# Altium footprint library Miscellaneous SMD.PcbLib: 82 footprints (part 1 of 7)
Each footprint in its own frame and in the unit in brackets; x right, y up, seen from the top. Pads: shape width x height; smd on the part's side, far side on the other; paste and mask are expansions set on the pad; w line width, h text height; cw(c..) or ccw(c..) is an arc to the next point about the centre after c.
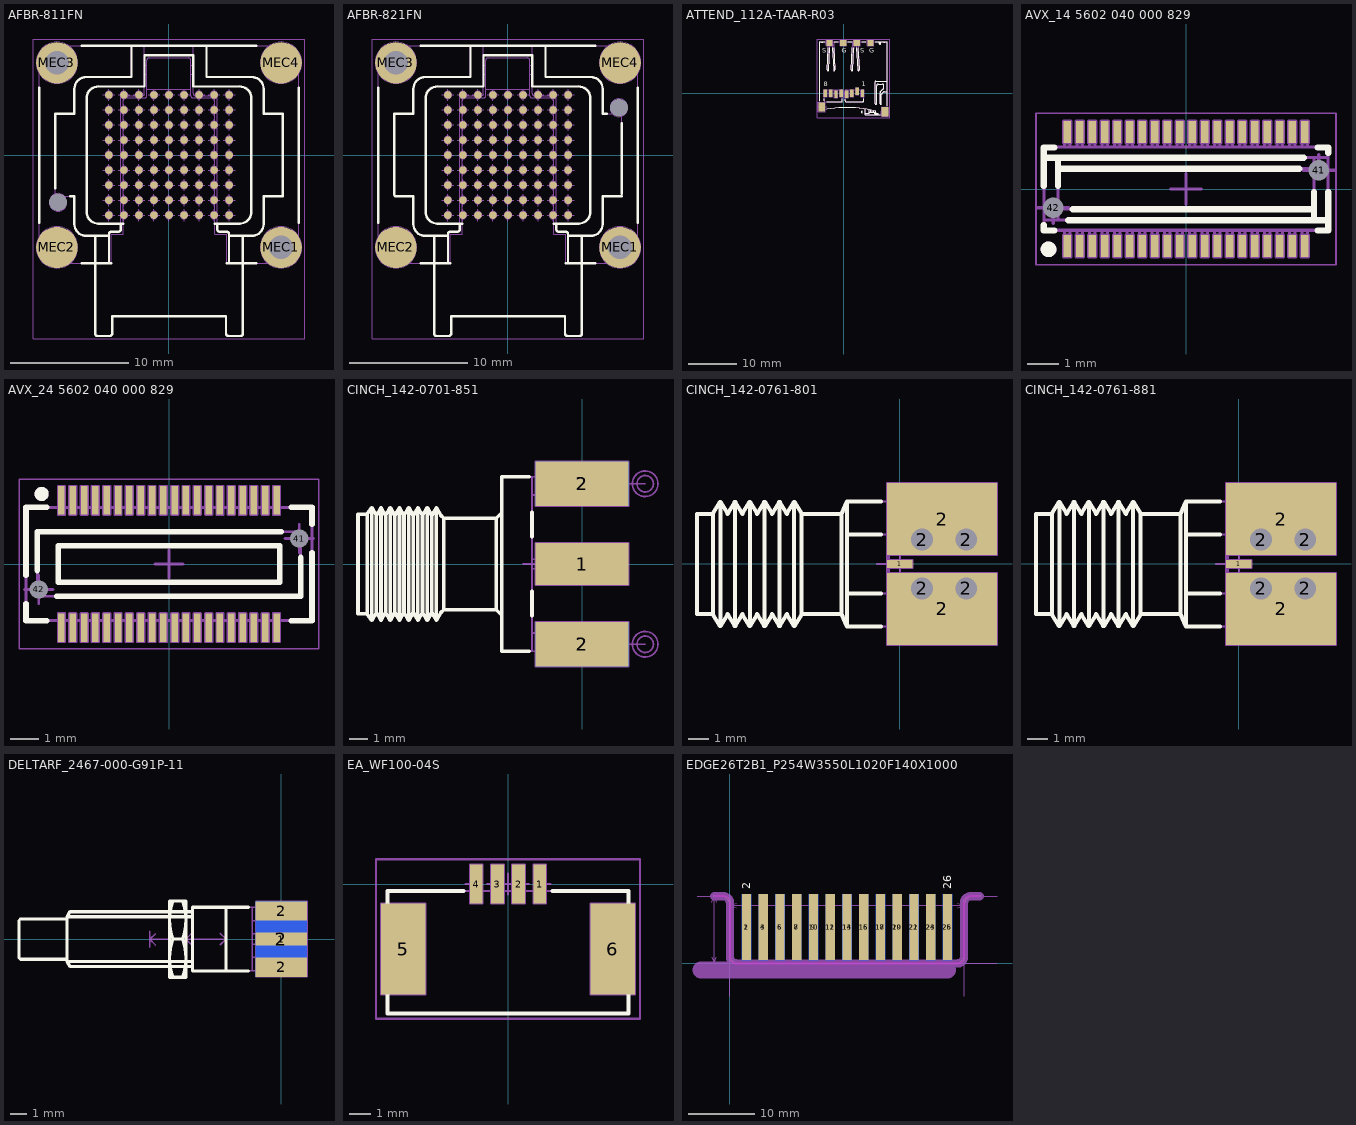
[diagram p0: the footprints below, top view; thin cyan lines are the x and y axes]

## AFBR-811FN [mm] "81 Pin BGA Pitch 1.27mm, 9X9 Fiber Optic Transmitter"
height 14.5
pads (86):
  round 0.64 smd: A1(5.08,-5.08) A2(3.81,-5.08) A3(2.54,-5.08) A4(1.27,-5.08) A5(0,-5.08) A6(-1.27,-5.08) A7(-2.54,-5.08) A8(-3.81,-5.08) A9(-5.08,-5.08) B1(5.08,-3.81) B2(3.81,-3.81) B3(2.54,-3.81) B4(1.27,-3.81) B5(0,-3.81) B6(-1.27,-3.81) B7(-2.54,-3.81) B8(-3.81,-3.81) B9(-5.08,-3.81) C1(5.08,-2.54) C2(3.81,-2.54) C3(2.54,-2.54) C4(1.27,-2.54) C5(0,-2.54) C6(-1.27,-2.54) C7(-2.54,-2.54) C8(-3.81,-2.54) C9(-5.08,-2.54) D1(5.08,-1.27) D2(3.81,-1.27) D3(2.54,-1.27) D4(1.27,-1.27) D5(0,-1.27) D6(-1.27,-1.27) D7(-2.54,-1.27) D8(-3.81,-1.27) D9(-5.08,-1.27) E1(5.08,0) E2(3.81,0) E3(2.54,0) E4(1.27,0) E5(0,0) E6(-1.27,0) E7(-2.54,0) E8(-3.81,0) E9(-5.08,0) F1(5.08,1.27) F2(3.81,1.27) F3(2.54,1.27) F4(1.27,1.27) F5(0,1.27) F6(-1.27,1.27) F7(-2.54,1.27) F8(-3.81,1.27) F9(-5.08,1.27) G1(5.08,2.54) G2(3.81,2.54) G3(2.54,2.54) G4(1.27,2.54) G5(0,2.54) G6(-1.27,2.54) G7(-2.54,2.54) G8(-3.81,2.54) G9(-5.08,2.54) H1(5.08,3.81) H2(3.81,3.81) H3(2.54,3.81) H4(1.27,3.81) H5(0,3.81) H6(-1.27,3.81) H7(-2.54,3.81) H8(-3.81,3.81) H9(-5.08,3.81) J1(5.08,5.08) J2(3.81,5.08) J3(2.54,5.08) J4(1.27,5.08) J5(0,5.08) J6(-1.27,5.08) J7(-2.54,5.08) J8(-3.81,5.08) J9(-5.08,5.08)
  round 3.5 hole 2: MEC1(9.475,-7.81) MEC3(-9.475,7.8)
  round 3.5 smd: MEC2(-9.475,-7.81) MEC4(9.475,7.8)
  round 0.5 hole 1.5 unplated mask+0.5: P1(-9.375,-4)
Top Overlay:
  lines w0.2: -10.975,-5.71 -10.975,5.71 ; -9.624,-2.8 -9.624,3.5 -7.997,3.5 -7.997,5.595 cw(c-6.997,5.595) -6.997,6.595 -3.175,6.595 -3.175,9.227 ; -8.353,-3.5 -7.997,-3.5 -7.997,-5.832 ccw(c-6.997,-5.832) -6.997,-6.832 -5.075,-6.832 ; -7.375,-9.144 -4.864,-9.144 ; -7.375,9.227 7.375,9.227 ; -6.244,-6.832 -6.237,-15.103 ccw(c-6.037,-15.103) -6.037,-15.303 -5.009,-15.303 ccw(c-5.009,-15.103) -4.809,-15.103 -4.809,-13.615 4.822,-13.615 4.822,-15.103 ccw(c5.022,-15.103) 5.022,-15.303 6.05,-15.303 ccw(c6.05,-15.103) 6.25,-15.103 6.25,-10.928 ; -5.075,-9.144 -5.075,-6.677 cw(c-4.875,-6.677) -4.875,-6.477 -4.275,-6.477 ccw(c-4.275,-6.277) -4.075,-6.277 -4.075,-5.798 ; -3.875,-5.798 -5.968,-5.798 cw(c-5.968,-4.798) -6.968,-4.798 -6.968,4.798 cw(c-5.968,4.798) -5.968,5.798 -2.075,5.798 -2.075,8.428 2.045,8.428 2.038,5.798 5.968,5.798 cw(c5.968,4.798) 6.968,4.798 6.968,-4.798 cw(c5.968,-4.798) 5.968,-5.798 3.875,-5.798 ; 3.175,9.227 3.175,6.595 6.997,6.595 cw(c6.997,5.595) 7.997,5.595 7.997,3.5 9.621,3.5 9.621,-3.5 7.997,-3.5 7.997,-5.832 cw(c6.997,-5.832) 6.997,-6.832 5.075,-6.832 ; 4.075,-5.798 4.075,-6.277 ccw(c4.275,-6.277) 4.275,-6.477 4.875,-6.477 cw(c4.875,-6.677) 5.075,-6.677 5.075,-9.144 ; 4.87,-9.144 7.375,-9.144 ; 6.25,-13.208 6.25,-6.832 ; 10.975,-5.71 10.975,5.71
Mechanical 8:
  drawing of 261 lines, arcs and shapes, not listed
Mechanical 14:
  circle w0.1: c-9.475,7.727 r1.5
  circle w0.1: c9.475,7.727 r1.5
  circle w0.1: c-9.475,-7.644 r1.5
  circle w0.1: c9.475,-7.644 r1.5
  lines w0.1: -10.975,7.727 -10.975,-7.644 ccw(c-9.475,-7.644) -9.475,-9.144 -4.864,-9.144 -4.864,-6.677 -3.875,-6.677 -3.875,4.623 cw(c-3.675,4.623) -3.675,4.823 -2.075,4.823 ccw(c-2.075,5.023) -1.875,5.023 -1.875,8.013 cw(c-1.675,8.013) -1.675,8.213 1.638,8.213 cw(c1.638,8.013) 1.838,8.013 1.838,5.023 ccw(c2.038,5.023) 2.038,4.823 3.675,4.823 cw(c3.675,4.623) 3.875,4.623 3.875,-6.677 4.87,-6.677 4.87,-9.144 9.488,-9.144 ccw(c9.488,-7.644) 10.988,-7.644 ; -9.475,9.227 9.475,9.227 ; -6.244,-13.208 -6.244,-6.832 ; -6.237,-10.928 -6.237,-15.103 ccw(c-6.037,-15.103) -6.037,-15.303 -5.009,-15.303 ccw(c-5.009,-15.103) -4.809,-15.103 -4.809,-13.615 4.822,-13.615 4.822,-15.103 ccw(c5.022,-15.103) 5.022,-15.303 6.05,-15.303 ccw(c6.05,-15.103) 6.25,-15.103 6.25,-10.928 ; -5.075,-9.144 -5.075,-6.677 cw(c-4.875,-6.677) -4.875,-6.477 -4.275,-6.477 ccw(c-4.275,-6.277) -4.075,-6.277 -4.075,-3.5 -4.075,3.5 -4.075,4.823 cw(c-3.875,4.823) -3.875,5.023 -2.275,5.023 ccw(c-2.275,5.223) -2.075,5.223 -2.075,9.227 ; -5.075,-6.832 -6.997,-6.832 cw(c-6.997,-5.832) -7.997,-5.832 -7.997,-3.5 -9.424,-3.5 cw(c-9.424,-3.3) -9.624,-3.3 -9.624,3.3 cw(c-9.424,3.3) -9.424,3.5 -7.997,3.5 -7.997,5.595 cw(c-6.997,5.595) -6.997,6.595 -3.175,6.595 -3.175,9.227 ; -3.875,-5.798 -5.968,-5.798 cw(c-5.968,-4.798) -6.968,-4.798 -6.968,4.798 cw(c-5.968,4.798) -5.968,5.798 -2.075,5.798 ; -2.075,6.816 -1.875,6.816 ; -2.075,7.61 -1.875,7.61 ; -2.075,8.428 2.045,8.428 2.045,7.636 ; -1.875,5.548 1.838,5.548 ; 1.838,6.816 2.041,6.816 ; 1.838,7.61 2.043,7.61 ; 2.038,5.798 5.968,5.798 cw(c5.968,4.798) 6.968,4.798 6.968,-4.798 cw(c5.968,-4.798) 5.968,-5.798 3.875,-5.798 ; 2.046,9.227 2.038,5.223 ccw(c2.238,5.223) 2.238,5.023 3.875,5.023 cw(c3.875,4.823) 4.075,4.823 4.075,-6.277 ccw(c4.275,-6.277) 4.275,-6.477 4.875,-6.477 cw(c4.875,-6.677) 5.075,-6.677 5.075,-9.144 ; 3.175,9.227 3.175,6.595 6.997,6.595 cw(c6.997,5.595) 7.997,5.595 7.997,3.5 9.621,3.5 9.621,-3.5 7.997,-3.5 7.997,-5.832 cw(c6.997,-5.832) 6.997,-6.832 5.075,-6.832 ; 6.25,-13.208 6.25,-6.832 ; 10.975,-7.644 10.975,7.727
Mechanical 15:
  lines w0.05: -11.475,-15.553 11.475,-15.553 11.475,9.81 -11.475,9.81 -11.475,-15.553
3D body "AFBR-811FN.stp": height 15.55, standoff -1.6, extent -10.975,-15.303 10.975,9.253

## AFBR-821FN [mm] "81 Pin BGA Pitch 1.27mm, 9X9 Fiber Optic Receiver"
height 14.5
pads (86):
  round 0.64 smd: A1(5.08,-5.08) A2(3.81,-5.08) A3(2.54,-5.08) A4(1.27,-5.08) A5(0,-5.08) A6(-1.27,-5.08) A7(-2.54,-5.08) A8(-3.81,-5.08) A9(-5.08,-5.08) B1(5.08,-3.81) B2(3.81,-3.81) B3(2.54,-3.81) B4(1.27,-3.81) B5(0,-3.81) B6(-1.27,-3.81) B7(-2.54,-3.81) B8(-3.81,-3.81) B9(-5.08,-3.81) C1(5.08,-2.54) C2(3.81,-2.54) C3(2.54,-2.54) C4(1.27,-2.54) C5(0,-2.54) C6(-1.27,-2.54) C7(-2.54,-2.54) C8(-3.81,-2.54) C9(-5.08,-2.54) D1(5.08,-1.27) D2(3.81,-1.27) D3(2.54,-1.27) D4(1.27,-1.27) D5(0,-1.27) D6(-1.27,-1.27) D7(-2.54,-1.27) D8(-3.81,-1.27) D9(-5.08,-1.27) E1(5.08,0) E2(3.81,0) E3(2.54,0) E4(1.27,0) E5(0,0) E6(-1.27,0) E7(-2.54,0) E8(-3.81,0) E9(-5.08,0) F1(5.08,1.27) F2(3.81,1.27) F3(2.54,1.27) F4(1.27,1.27) F5(0,1.27) F6(-1.27,1.27) F7(-2.54,1.27) F8(-3.81,1.27) F9(-5.08,1.27) G1(5.08,2.54) G2(3.81,2.54) G3(2.54,2.54) G4(1.27,2.54) G5(0,2.54) G6(-1.27,2.54) G7(-2.54,2.54) G8(-3.81,2.54) G9(-5.08,2.54) H1(5.08,3.81) H2(3.81,3.81) H3(2.54,3.81) H4(1.27,3.81) H5(0,3.81) H6(-1.27,3.81) H7(-2.54,3.81) H8(-3.81,3.81) H9(-5.08,3.81) J1(5.08,5.08) J2(3.81,5.08) J3(2.54,5.08) J4(1.27,5.08) J5(0,5.08) J6(-1.27,5.08) J7(-2.54,5.08) J8(-3.81,5.08) J9(-5.08,5.08)
  round 3.5 hole 2: MEC1(9.475,-7.81) MEC3(-9.475,7.8)
  round 3.5 smd: MEC2(-9.475,-7.81) MEC4(9.475,7.8)
  round 0.5 hole 1.5 unplated mask+0.5: P1(9.375,4)
Top Overlay:
  lines w0.2: -10.975,-5.71 -10.975,5.71 ; -7.375,-9.144 -4.864,-9.144 ; -7.375,9.227 7.375,9.227 ; -6.244,-6.832 -6.237,-15.103 ccw(c-6.037,-15.103) -6.037,-15.303 -5.009,-15.303 ccw(c-5.009,-15.103) -4.809,-15.103 -4.809,-13.615 4.822,-13.615 4.822,-15.103 ccw(c5.022,-15.103) 5.022,-15.303 6.05,-15.303 ccw(c6.05,-15.103) 6.25,-15.103 6.25,-10.928 ; -5.075,-9.144 -5.075,-6.677 cw(c-4.875,-6.677) -4.875,-6.477 -4.275,-6.477 ccw(c-4.275,-6.277) -4.075,-6.277 -4.075,-5.798 ; -5.075,-6.832 -6.997,-6.832 cw(c-6.997,-5.832) -7.997,-5.832 -7.997,-3.5 -9.424,-3.5 cw(c-9.424,-3.3) -9.624,-3.3 -9.624,3.5 -7.997,3.5 -7.997,5.595 cw(c-6.997,5.595) -6.997,6.595 -3.175,6.595 -3.175,9.227 ; -3.875,-5.798 -5.968,-5.798 cw(c-5.968,-4.798) -6.968,-4.798 -6.968,4.798 cw(c-5.968,4.798) -5.968,5.798 -2.075,5.798 -2.075,8.428 2.045,8.428 2.038,5.798 5.968,5.798 cw(c5.968,4.798) 6.968,4.798 6.968,-4.798 cw(c5.968,-4.798) 5.968,-5.798 3.875,-5.798 ; 3.175,9.227 3.175,6.595 6.997,6.595 cw(c6.997,5.595) 7.997,5.595 7.997,3.5 8.353,3.5 ; 4.075,-5.798 4.075,-6.277 ccw(c4.275,-6.277) 4.275,-6.477 4.875,-6.477 cw(c4.875,-6.677) 5.075,-6.677 5.075,-9.144 ; 4.87,-9.144 7.375,-9.144 ; 5.075,-6.832 6.997,-6.832 ccw(c6.997,-5.832) 7.997,-5.832 7.997,-3.5 9.621,-3.5 ; 6.25,-13.208 6.25,-6.832 ; 9.624,-3.3 9.624,2.703 ; 10.975,-5.71 10.975,5.71
Mechanical 8:
  drawing of 270 lines, arcs and shapes, not listed
Mechanical 14:
  circle w0.1: c9.475,-7.644 r1.5
  circle w0.1: c-9.475,-7.644 r1.5
  circle w0.1: c9.475,7.727 r1.5
  circle w0.1: c-9.475,7.727 r1.5
  lines w0.1: -10.975,7.727 -10.975,-7.644 ccw(c-9.475,-7.644) -9.475,-9.144 -4.864,-9.144 -4.864,-6.677 -3.875,-6.677 -3.875,4.623 cw(c-3.675,4.623) -3.675,4.823 -2.075,4.823 ccw(c-2.075,5.023) -1.875,5.023 -1.875,8.013 cw(c-1.675,8.013) -1.675,8.213 1.638,8.213 cw(c1.638,8.013) 1.838,8.013 1.838,5.023 ccw(c2.038,5.023) 2.038,4.823 3.675,4.823 cw(c3.675,4.623) 3.875,4.623 3.875,-6.677 4.87,-6.677 4.87,-9.144 9.488,-9.144 ccw(c9.488,-7.644) 10.988,-7.644 ; -9.475,9.227 9.475,9.227 ; -6.244,-13.208 -6.244,-6.832 ; -6.237,-10.928 -6.237,-15.103 ccw(c-6.037,-15.103) -6.037,-15.303 -5.009,-15.303 ccw(c-5.009,-15.103) -4.809,-15.103 -4.809,-13.615 4.822,-13.615 4.822,-15.103 ccw(c5.022,-15.103) 5.022,-15.303 6.05,-15.303 ccw(c6.05,-15.103) 6.25,-15.103 6.25,-10.928 ; -5.075,-9.144 -5.075,-6.677 cw(c-4.875,-6.677) -4.875,-6.477 -4.275,-6.477 ccw(c-4.275,-6.277) -4.075,-6.277 -4.075,-3.5 -4.075,3.5 -4.075,4.823 cw(c-3.875,4.823) -3.875,5.023 -2.275,5.023 ccw(c-2.275,5.223) -2.075,5.223 -2.075,9.227 ; -5.075,-6.832 -6.997,-6.832 cw(c-6.997,-5.832) -7.997,-5.832 -7.997,-3.5 -9.424,-3.5 cw(c-9.424,-3.3) -9.624,-3.3 -9.624,3.3 cw(c-9.424,3.3) -9.424,3.5 -7.997,3.5 -7.997,5.595 cw(c-6.997,5.595) -6.997,6.595 -3.175,6.595 -3.175,9.227 ; -3.875,-5.798 -5.968,-5.798 cw(c-5.968,-4.798) -6.968,-4.798 -6.968,4.798 cw(c-5.968,4.798) -5.968,5.798 -2.075,5.798 ; -2.075,6.816 -1.875,6.816 ; -2.075,7.61 -1.875,7.61 ; -2.075,8.428 2.045,8.428 2.045,7.636 ; -1.875,5.548 1.838,5.548 ; 1.838,6.816 2.041,6.816 ; 1.838,7.61 2.043,7.61 ; 2.038,5.798 5.968,5.798 cw(c5.968,4.798) 6.968,4.798 6.968,-4.798 cw(c5.968,-4.798) 5.968,-5.798 3.875,-5.798 ; 2.046,9.227 2.038,5.223 ccw(c2.238,5.223) 2.238,5.023 3.875,5.023 cw(c3.875,4.823) 4.075,4.823 4.075,-6.277 ccw(c4.275,-6.277) 4.275,-6.477 4.875,-6.477 cw(c4.875,-6.677) 5.075,-6.677 5.075,-9.144 ; 3.175,9.227 3.175,6.595 6.997,6.595 cw(c6.997,5.595) 7.997,5.595 7.997,3.5 9.621,3.5 9.621,-3.5 7.997,-3.5 7.997,-5.832 cw(c6.997,-5.832) 6.997,-6.832 5.075,-6.832 ; 6.25,-13.208 6.25,-6.832 ; 10.975,-7.644 10.975,7.727
Mechanical 15:
  lines w0.05: -11.475,-15.553 -11.475,9.81 11.475,9.81 11.475,-15.553 -11.475,-15.553
3D body "AFBR-821FN.stp": height 15.55, standoff -1.6, extent -10.975,-15.303 10.975,9.253

## ATTEND_112A-TAAR-R03 [mm] "MicroSD Socket, Push-Push Type"
height 1.9
pads (14):
  rect 0.7x1.5 smd: 1(3.85,0) 2(2.75,0.4) 3(1.65,0) 4(0.55,-0.2) 5(-0.55,0) 6(-1.65,-0.2) 7(-2.75,0) 8(-3.85,0)
  rect 1.4x1.9 smd: 9(-4.6,-2.85) 9(8.53,-3.85)
  rect 1.3x1.2 smd: 9(-0.17,10.4) 9(5.53,10.4) 10(-3.02,10.4) 10(2.68,10.4)
Top Overlay:
  circle w0.25: c3.7,-3.9 r0.125
  lines w0.2: -5.07,-1.55 -5.07,10.7 -4.02,10.7 ; -4.67,10.7 ccw(c-4.52,10.7) -4.37,10.7 ; -4.12,-1.55 -4.12,-1.1 ; -3.57,-3.37 cw(c0.63,-27) 6.517,-3.733 ; -3.57,-1.8 -0.52,-1.8 ccw(c-0.52,-1.6) -0.32,-1.6 -0.32,-1.1 ; -3.234,9.45 -3.47,4.858 ccw(c-3.32,4.85) -3.17,4.845 -2.934,9.45 ; -2.406,9.45 -2.17,4.845 ccw(c-2.02,4.85) -1.87,4.858 -2.106,9.45 ; -2.02,10.7 -1.17,10.7 ; 0.28,-1.3 0.28,-1.6 ccw(c0.48,-1.6) 0.48,-1.8 3.88,-1.8 ccw(c3.88,-1.6) 4.08,-1.6 4.08,-1.1 ; 0.83,10.7 1.68,10.7 ; 1.766,9.45 1.53,4.858 ccw(c1.68,4.85) 1.83,4.845 2.066,9.45 ; 2.594,9.45 2.83,4.845 ccw(c2.98,4.85) 3.13,4.858 2.894,9.45 ; 3.68,10.7 4.53,10.7 ; 4.43,-4.167 5.25,-4.167 5.25,-3.449 ; 4.43,-3.303 4.43,-4.5 7.48,-4.5 ; 5.25,-4 6.22,-4 ; 5.57,-3.514 5.57,-3.8 6.22,-3.8 ; 6.22,-3.66 6.22,-4 ; 6.517,-3.733 cw(c6.48,-3.879) 6.63,-3.879 6.63,-4.2 7.11,-4.2 7.11,-4.5 ; 6.52,-4.5 6.22,-4 ; 6.53,10.7 7.33,10.7 7.33,10.35 ccw(c7.48,10.35) 7.63,10.35 7.63,10.7 ; 6.61,-4.25 6.61,-4 ; 6.627,-3.85 6.46,-3.85 ; 6.63,-4 6.61,-4 ; 7.11,-4.25 6.46,-4.25 6.46,-3.85 ; 7.33,10.37 7.58,10.37 7.58,10.7 8.23,10.7 ccw(c8.38,10.7) 8.53,10.7 8.93,10.7 8.93,-2.55 ; 7.33,10.52 7.58,10.52 ; 8.93,0.3 8.342,0.3 ccw(c8.342,0.15) 8.236,0.256 7.824,-0.156 ccw(c7.93,-0.262) 7.78,-0.262 7.78,-2.15 cw(c7.63,-2.15) 7.48,-2.15 7.48,0.076 cw(c7.78,0.076) 7.568,0.288 8.192,0.912 ccw(c7.98,1.124) 8.28,1.124 8.28,1.6 ccw(c7.98,1.6) 7.98,1.9 7.08,1.9 ccw(c7.08,1.6) 6.78,1.6 6.78,-2.15 cw(c6.63,-2.15) 6.48,-2.15 6.48,2.35 cw(c6.63,2.35) 6.63,2.5 8.93,2.5 ; 6.46,-3.85 6.61,-4
  text "1" at 3.7,1.4 h1
  text "8" at -4.2,1.4 h1
  text "S" at -4.5,8.4 h1
  text "G" at -0.5,8.4 h1
  text "S" at 3.4,8.4 h1
  text "G" at 5.2,8.4 h1
Mechanical 8:
  lines w0.05: -5.62,-2.85 -3.62,-2.85 ; -4.62,-3.85 -4.62,-1.85 ; -4.2,0 -3.85,0 -3.85,-0.75 ; -3.67,10.4 -3.02,10.4 -3.02,9.8 ; -3.1,0 -2.75,0 -2.75,-0.75 ; -2,-0.2 -1.65,-0.2 -1.65,-0.95 ; -0.9,0 -0.55,0 -0.55,-0.75 ; -0.82,10.4 -0.17,10.4 -0.17,9.8 ; -0.354,-0.354 0,0 ; -0.354,0.354 0,0 ; 0.2,-0.2 0.55,-0.2 0.55,-0.95 ; 0.353,-0.354 0,0 ; 0.353,0.354 0,0 ; 1.3,0 1.65,0 1.65,-0.75 ; 2.03,10.4 2.68,10.4 2.68,9.8 ; 2.4,0.4 2.75,0.4 2.75,-0.35 ; 3.5,0 3.85,0 3.85,-0.75 ; 4.88,10.4 5.53,10.4 5.53,9.8 ; 7.53,-3.85 9.53,-3.85 ; 8.53,-4.85 8.53,-2.85 ; -5.32,-3.8 -5.32,-1.9 -3.92,-1.9 -3.92,-3.8 -5.32,-3.8 ; -4.2,-0.75 -4.2,0.75 -3.5,0.75 -3.5,-0.75 -4.2,-0.75 ; -3.67,9.8 -3.67,11 -2.37,11 -2.37,9.8 -3.67,9.8 ; -3.1,-0.75 -3.1,0.75 -2.4,0.75 -2.4,-0.75 -3.1,-0.75 ; -2,-0.95 -2,0.55 -1.3,0.55 -1.3,-0.95 -2,-0.95 ; -0.9,-0.75 -0.9,0.75 -0.2,0.75 -0.2,-0.75 -0.9,-0.75 ; -0.82,9.8 -0.82,11 0.48,11 0.48,9.8 -0.82,9.8 ; 0.2,-0.95 0.2,0.55 0.9,0.55 0.9,-0.95 0.2,-0.95 ; 1.3,-0.75 1.3,0.75 2,0.75 2,-0.75 1.3,-0.75 ; 2.03,9.8 2.03,11 3.33,11 3.33,9.8 2.03,9.8 ; 2.4,-0.35 2.4,1.15 3.1,1.15 3.1,-0.35 2.4,-0.35 ; 3.5,-0.75 3.5,0.75 4.2,0.75 4.2,-0.75 3.5,-0.75 ; 4.88,9.8 4.88,11 6.18,11 6.18,9.8 4.88,9.8 ; 7.83,-4.8 7.83,-2.9 9.23,-2.9 9.23,-4.8 7.83,-4.8
Mechanical 14:
  lines w0.1: -4.67,10.7 ccw(c-4.52,10.7) -4.37,10.7 ; -4,0.683 -4,-0.205 -3.7,-0.205 -3.7,0.7 ; -3.77,10.7 -3.77,10.35 ccw(c-3.62,10.35) -3.47,10.35 -3.47,10.7 7.33,10.7 7.33,10.35 ccw(c7.48,10.35) 7.63,10.35 7.63,10.7 ; -3.72,10.238 -3.72,10.7 -5.07,10.7 -5.07,-3.5 -4.243,-3.5 cw(c0.63,-27) 6.517,-3.733 ; -3.62,10.2 -3.62,10.503 cw(c-3.47,10.503) -3.47,10.653 ; -3.209,9.95 -2.908,9.95 ; -3.201,10.1 -2.894,10.1 ; -3.178,10.55 -2.162,10.55 ; -3.17,10.7 -3.47,4.858 ccw(c-3.32,4.85) -3.17,4.845 -2.903,10.058 cw(c-2.753,10.05) -2.753,10.2 -2.587,10.2 cw(c-2.587,10.05) -2.438,10.058 -2.17,4.845 ccw(c-2.02,4.85) -1.87,4.858 -2.17,10.7 ; -2.9,0.7 -2.9,-0.205 -2.6,-0.205 -2.6,0.7 ; -2.446,10.1 -2.139,10.1 ; -2.432,9.95 -2.132,9.95 ; -1.8,0.7 -1.8,-0.203 -1.5,-0.203 -1.5,0.7 ; -0.7,0.7 -0.7,-0.205 -0.4,-0.205 -0.4,0.66 ; 0.4,0.683 0.4,-0.203 0.7,-0.203 0.7,0.7 ; 1.5,0.7 1.5,-0.205 1.8,-0.205 1.8,0.7 ; 1.791,9.95 2.092,9.95 ; 1.799,10.1 2.106,10.1 ; 1.822,10.55 2.838,10.55 ; 1.83,10.7 1.53,4.858 ccw(c1.68,4.85) 1.83,4.845 2.097,10.058 cw(c2.247,10.05) 2.247,10.2 2.413,10.2 cw(c2.413,10.05) 2.562,10.058 2.83,4.845 ccw(c2.98,4.85) 3.13,4.858 2.83,10.7 ; 2.554,10.1 2.861,10.1 ; 2.568,9.95 2.868,9.95 ; 2.6,0.7 2.6,-0.203 2.9,-0.203 2.9,0.7 ; 3.7,0.7 3.7,-0.205 4,-0.205 4,0.66 ; 4.43,-4.167 5.25,-4.167 5.25,-3.449 ; 4.43,-3.303 4.43,-4.5 8.785,-4.5 ccw(c8.785,-4.35) 8.935,-4.35 8.935,-3.45 ccw(c8.785,-3.45) 8.785,-3.3 7.98,-3.3 cw(c7.98,-3.15) 7.83,-3.15 7.83,-3.05 cw(c7.98,-3.05) 7.98,-2.9 8.93,-2.9 8.93,10.7 8.53,10.7 cw(c8.38,10.7) 8.23,10.7 7.58,10.7 7.58,10.37 7.33,10.37 ; 5.25,-4 6.22,-4 ; 5.57,-3.514 5.57,-3.8 6.22,-3.8 ; 6.22,-3.66 6.22,-4 ; 6.517,-3.733 cw(c6.48,-3.879) 6.63,-3.879 6.63,-4.2 7.11,-4.2 7.11,-4.5 ; 6.52,-4.5 6.22,-4 ; 6.61,-4.25 6.61,-4 ; 6.627,-3.85 6.46,-3.85 ; 6.63,-4 6.61,-4 ; 7.11,-4.25 6.46,-4.25 6.46,-3.85 ; 7.33,10.52 7.58,10.52 ; 7.51,-4.5 cw(c7.66,-4.5) 7.81,-4.5 ; 8.93,0.3 8.342,0.3 ccw(c8.342,0.15) 8.236,0.256 7.824,-0.156 ccw(c7.93,-0.262) 7.78,-0.262 7.78,-2.15 cw(c7.63,-2.15) 7.48,-2.15 7.48,0.076 cw(c7.78,0.076) 7.568,0.288 8.192,0.912 ccw(c7.98,1.124) 8.28,1.124 8.28,1.6 ccw(c7.98,1.6) 7.98,1.9 7.08,1.9 ccw(c7.08,1.6) 6.78,1.6 6.78,-2.15 cw(c6.63,-2.15) 6.48,-2.15 6.48,2.35 cw(c6.63,2.35) 6.63,2.5 8.93,2.5 ; 6.46,-3.85 6.61,-4 ; -4.12,-1.6 ccw(c-3.92,-1.6) -3.92,-1.8 -0.52,-1.8 ccw(c-0.52,-1.6) -0.32,-1.6 -0.32,0.5 ccw(c-0.52,0.5) -0.52,0.7 -3.92,0.7 ccw(c-3.92,0.5) -4.12,0.5 -4.12,-1.6 ; 0.28,-1.6 ccw(c0.48,-1.6) 0.48,-1.8 3.88,-1.8 ccw(c3.88,-1.6) 4.08,-1.6 4.08,0.5 ccw(c3.88,0.5) 3.88,0.7 0.48,0.7 ccw(c0.48,0.5) 0.28,0.5 0.28,-1.6
Mechanical 15:
  lines w0.05: -5.57,-5.05 -5.57,11.25 9.48,11.25 9.48,-5.05 -5.57,-5.05
3D body "ATTEND_112A-TAAR-R03.stp": height 1.83, standoff 0, extent -5.07,-4.5 8.935,10.7

## AVX_14 5602 040 000 829 [mm] "40 Contacts, Fine Pitch 0.4mm, Surface Mount, Board to Board Plug Connector, 5602 Series"
height 1.2
pads (42):
  rect 0.23x0.7 smd: 1(-3.8,-1.83) 2(-3.4,-1.83) 3(-3,-1.83) 4(-2.6,-1.83) 5(-2.2,-1.83) 6(-1.8,-1.83) 7(-1.4,-1.83) 8(-1,-1.83) 9(-0.6,-1.83) 10(-0.2,-1.83) 11(0.2,-1.83) 12(0.6,-1.83) 13(1,-1.83) 14(1.4,-1.83) 15(1.8,-1.83) 16(2.2,-1.83) 17(2.6,-1.83) 18(3,-1.83) 19(3.4,-1.83) 20(3.8,-1.83) 21(3.8,1.83) 22(3.4,1.83) 23(3,1.83) 24(2.6,1.83) 25(2.2,1.83) 26(1.8,1.83) 27(1.4,1.83) 28(1,1.83) 29(0.6,1.83) 30(0.2,1.83) 31(-0.2,1.83) 32(-0.6,1.83) 33(-1,1.83) 34(-1.4,1.83) 35(-1.8,1.83) 36(-2.2,1.83) 37(-2.6,1.83) 38(-3,1.83) 39(-3.4,1.83) 40(-3.8,1.83)
  round 0.5 hole 0.65 unplated mask+0.075: 41(4.25,0.6) 42(-4.25,-0.6)
Top Overlay:
  circle w0.25: c-4.4,-1.931 r0.125
  lines w0.2: -4.55,-1.148 -4.55,-1.33 -4.215,-1.33 ; -4.55,0.1 -4.55,1.33 -4.215,1.33 ; -4.55,1 3.77,1 ; -4.1,0.1 -4.1,1 ; -4.1,0.65 3.627,0.65 ; -3.77,-1 4.55,-1 ; -3.627,-0.65 4.1,-0.65 ; 4.1,-1 4.1,-0.1 ; 4.215,-1.33 4.55,-1.33 4.55,-0.1 ; 4.215,1.33 4.55,1.33 4.55,1.148
Mechanical 8:
  drawing of 250 lines, arcs and shapes, not listed
Mechanical 14:
  circle w0.25: c-4.4,-1.931 r0.125
  lines w0.1: -4.55,-0.99 4.55,-0.99 ; -4.55,1.01 4.55,1.01 ; -4.1,-0.99 -4.1,1.01 ; -4.1,-0.64 4.1,-0.64 ; -4.1,0.66 4.1,0.66 ; -3.885,-1.32 -3.885,-1.92 -3.715,-1.92 -3.715,-1.32 ; -3.885,1.34 -3.885,1.94 -3.715,1.94 -3.715,1.34 ; -3.485,-1.32 -3.485,-1.92 -3.315,-1.92 -3.315,-1.32 ; -3.485,1.34 -3.485,1.94 -3.315,1.94 -3.315,1.34 ; -3.085,-1.32 -3.085,-1.92 -2.915,-1.92 -2.915,-1.32 ; -3.085,1.34 -3.085,1.94 -2.915,1.94 -2.915,1.34 ; -2.685,-1.32 -2.685,-1.92 -2.515,-1.92 -2.515,-1.32 ; -2.685,1.34 -2.685,1.94 -2.515,1.94 -2.515,1.34 ; -2.285,-1.32 -2.285,-1.92 -2.115,-1.92 -2.115,-1.32 ; -2.285,1.34 -2.285,1.94 -2.115,1.94 -2.115,1.34 ; -1.885,-1.32 -1.885,-1.92 -1.715,-1.92 -1.715,-1.32 ; -1.885,1.34 -1.885,1.94 -1.715,1.94 -1.715,1.34 ; -1.485,-1.32 -1.485,-1.92 -1.315,-1.92 -1.315,-1.32 ; -1.485,1.34 -1.485,1.94 -1.315,1.94 -1.315,1.34 ; -1.085,-1.32 -1.085,-1.92 -0.915,-1.92 -0.915,-1.32 ; -1.085,1.34 -1.085,1.94 -0.915,1.94 -0.915,1.34 ; -0.685,-1.32 -0.685,-1.92 -0.515,-1.92 -0.515,-1.32 ; -0.685,1.34 -0.685,1.94 -0.515,1.94 -0.515,1.34 ; -0.285,-1.32 -0.285,-1.92 -0.115,-1.92 -0.115,-1.32 ; -0.285,1.34 -0.285,1.94 -0.115,1.94 -0.115,1.34 ; 0.115,-1.32 0.115,-1.92 0.285,-1.92 0.285,-1.32 ; 0.115,1.34 0.115,1.94 0.285,1.94 0.285,1.34 ; 0.515,-1.32 0.515,-1.92 0.685,-1.92 0.685,-1.32 ; 0.515,1.34 0.515,1.94 0.685,1.94 0.685,1.34 ; 0.915,-1.32 0.915,-1.92 1.085,-1.92 1.085,-1.32 ; 0.915,1.34 0.915,1.94 1.085,1.94 1.085,1.34 ; 1.315,-1.32 1.315,-1.92 1.485,-1.92 1.485,-1.32 ; 1.315,1.34 1.315,1.94 1.485,1.94 1.485,1.34 ; 1.715,-1.32 1.715,-1.92 1.885,-1.92 1.885,-1.32 ; 1.715,1.34 1.715,1.94 1.885,1.94 1.885,1.34 ; 2.115,-1.32 2.115,-1.92 2.285,-1.92 2.285,-1.32 ; 2.115,1.34 2.115,1.94 2.285,1.94 2.285,1.34 ; 2.515,-1.32 2.515,-1.92 2.685,-1.92 2.685,-1.32 ; 2.515,1.34 2.515,1.94 2.685,1.94 2.685,1.34 ; 2.915,-1.32 2.915,-1.92 3.085,-1.92 3.085,-1.32 ; 2.915,1.34 2.915,1.94 3.085,1.94 3.085,1.34 ; 3.315,-1.32 3.315,-1.92 3.485,-1.92 3.485,-1.32 ; 3.315,1.34 3.315,1.94 3.485,1.94 3.485,1.34 ; 3.715,-1.32 3.715,-1.92 3.885,-1.92 3.885,-1.32 ; 3.715,1.34 3.715,1.94 3.885,1.94 3.885,1.34 ; 4.1,-0.99 4.1,1.01 ; -4.55,-1.32 -4.55,1.34 4.55,1.34 4.55,-1.32 -4.55,-1.32
Mechanical 15:
  lines w0.05: -4.8,-2.43 4.8,-2.43 4.8,2.43 -4.8,2.43 -4.8,-2.43
3D body "AVX_14 5602 040 000 829.stp": height 1.2, standoff -0.45, extent -4.55,-1.93 4.55,1.93
